# Altium footprint library Derogarian_Library.PcbLib: 99 footprints (part 2 of 7)
Each footprint in its own frame and in the unit in brackets; x right, y up, seen from the top. Pads: shape width x height; smd on the part's side, far side on the other; paste and mask are expansions set on the pad; w line width, h text height; cw(c..) or ccw(c..) is an arc to the next point about the centre after c.
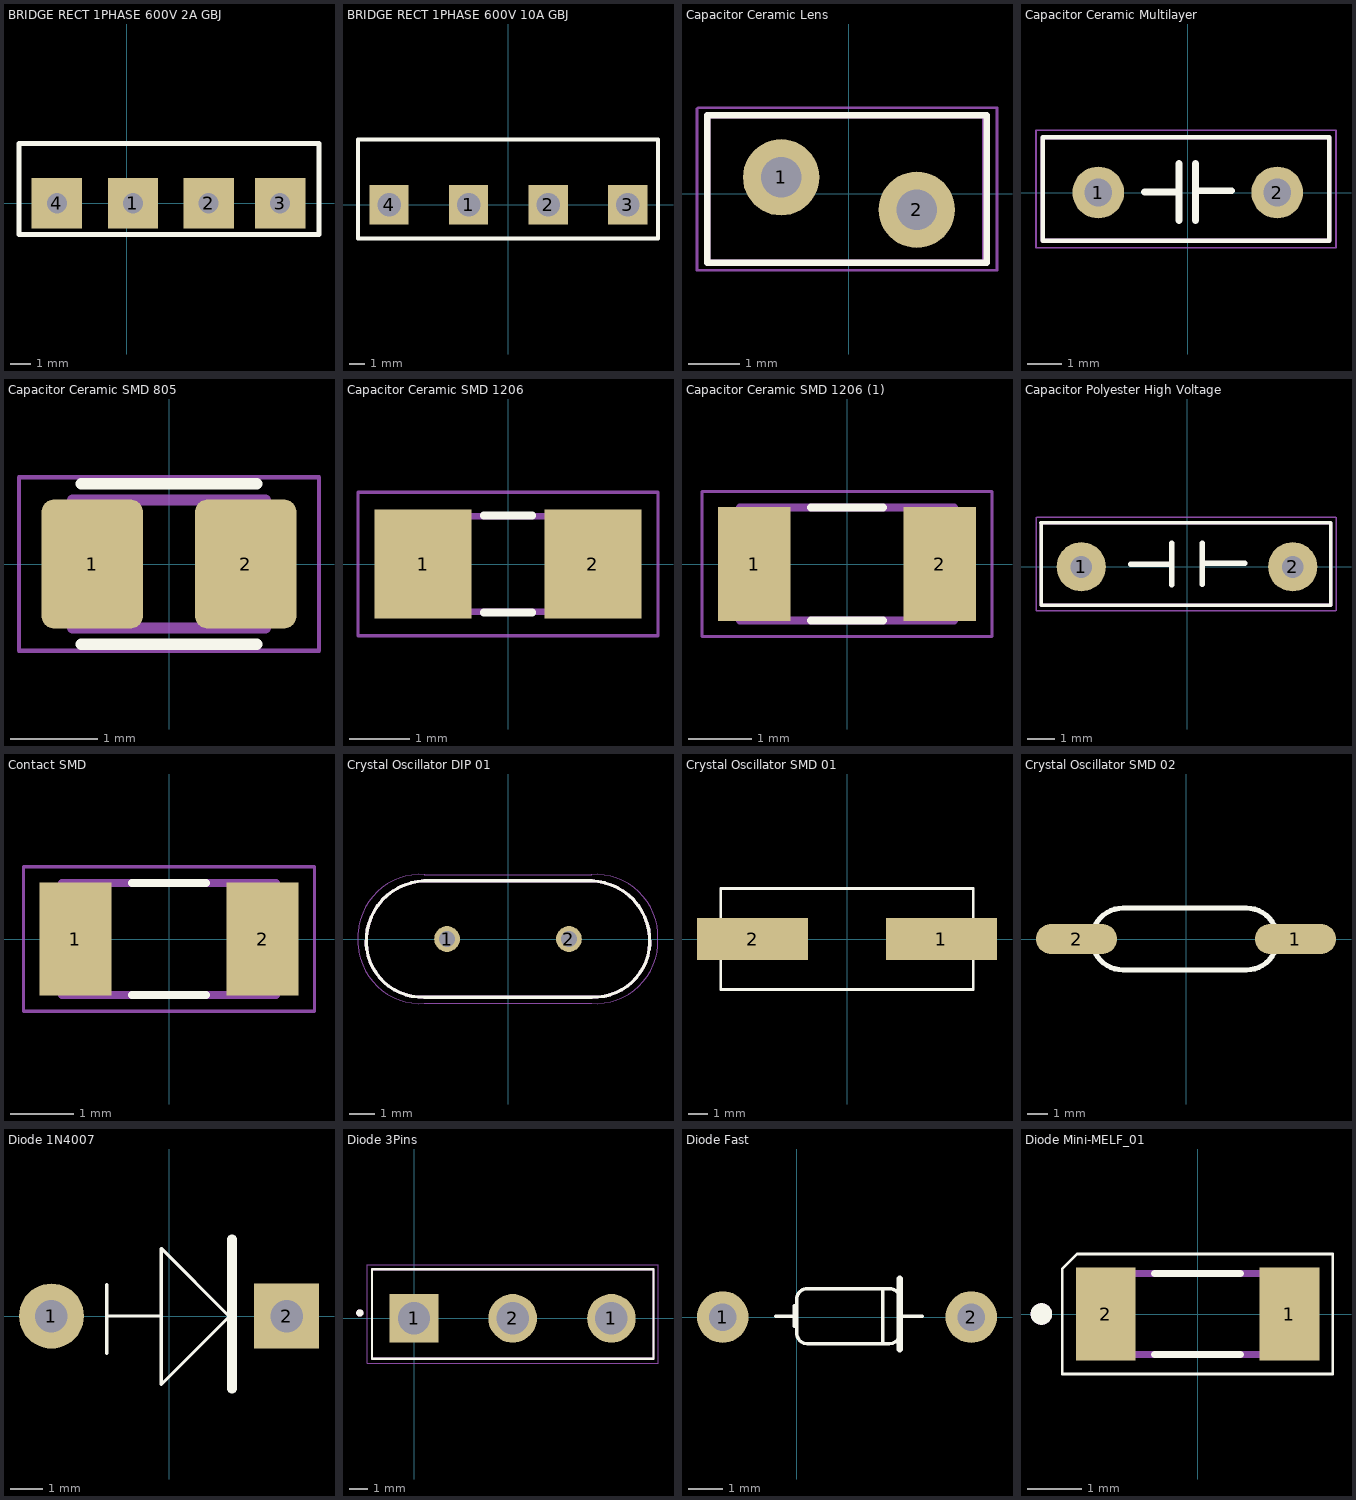
[diagram p1: the footprints below, top view; thin cyan lines are the x and y axes]

## BRIDGE RECT 1PHASE 600V 2A GBJ [mm] "GBJ1006TB"
pads (4):
  rect 2.5x2.5 hole 1: 1(0.305,0) 2(4.064,0) 3(7.62,0) 4(-3.48,0)
Top Overlay:
  lines w0.254: -5.359,-1.549 -5.359,2.972 9.55,2.972 9.55,-1.549 -5.359,-1.549
3D body "User Library-Silicon Bridge Rectifiers KBP06.STEP": height 15.68, standoff -16.67, extent -5.191,-1.256 9.559,2.794

## BRIDGE RECT 1PHASE 600V 10A GBJ [mm] "GBJ1006TB"
pads (4):
  rect 2.5x2.5 hole 1.5: 1(-2.54,0) 2(2.54,0) 3(7.62,0) 4(-7.62,0)
Top Overlay:
  lines w0.254: -9.601,-2.159 -9.601,4.166 9.55,4.166 9.55,-2.159 -9.601,-2.159
3D body "User Library-KBL-1.STEP": height 16.75, standoff -3.5, extent -9.5,-2.235 9.5,4.015

## Capacitor Ceramic Lens [mm] "Through Hole Ceramic Capacitors"
pads (2):
  round 1.5 hole 0.8: 1(-1.333,0.318) 2(1.333,-0.318)
Top Overlay:
  lines w0.127: -2.787,1.543 -2.787,-1.359 2.706,-1.359 2.706,1.537 -2.781,1.537
Mechanical 13:
  lines w0.127: -2.787,-1.359 -2.787,1.537 2.68,1.537 2.68,-1.359 -2.787,-1.359
Mechanical 15:
  lines w0.05: -2.987,1.664 -2.987,-1.511 2.909,-1.511 2.909,1.69 -2.957,1.688
3D body "User Library-Cer-Cap2 (3_5x1_5).STEP": height 4.5, standoff -2, extent -1.66,-0.853 1.84,0.648

## Capacitor Ceramic Multilayer [mm] "Through Hole Ceramic Capacitors"
pads (2):
  round 1.5 hole 0.8: 1(-2.594,0) 2(2.594,0)
Top Overlay:
  lines w0.127: -4.198,-1.398 -4.198,1.602 4.094,1.602 ; -4.194,-1.398 4.094,-1.398 ; 4.097,-1.398 4.097,1.602
  lines w0.2: -1.254,0.013 -0.254,0.013 ; -0.254,-0.813 -0.254,0.838 ; 0.229,-0.813 0.229,0.838 ; 0.27,0.051 1.27,0.051
Mechanical 13:
  lines w0.127: 4.094,-1.398 -4.198,-1.398 -4.198,1.596 -4.194,1.6 4.094,1.6 ; 4.097,-1.398 4.097,1.6
Mechanical 15:
  lines w0.05: -4.398,1.802 -4.398,-1.598 4.29,-1.598 ; -4.397,1.802 4.29,1.803 ; 4.297,-1.598 4.297,1.802
3D body "c322c104k5r5ta.stp": height 7.31, standoff -6.29, extent -2.67,-1.51 2.92,1.675

## Capacitor Ceramic SMD 805 [mm]
pads (2):
  rrect25% 1.16x1.47 smd: 1(-0.875,0) 2(0.875,0)
Top Overlay:
  lines w0.127: -1,-0.915 1,-0.915 ; -1,0.915 1,0.915
Mechanical 13:
  lines w0: -0.356,-0.737 0.356,-0.737
  lines w0.127: -1.1,-0.73 -1.1,0.73 1.1,0.73 1.1,-0.73 -1.1,-0.73
Mechanical 15:
  lines w0.05: -1.71,-0.99 -1.71,0.99 1.71,0.99 1.71,-0.99 -1.71,-0.99
3D body "C0805C102K1RACTU.STEP": height 1.23, standoff -0.04, extent -0.94,-0.686 1.092,0.711

## Capacitor Ceramic SMD 1206 [mm]
pads (2):
  rect 1.6x1.8 smd: 1(-1.4,0) 2(1.4,0)
Top Overlay:
  lines w0.127: -0.4,-0.8 0.4,-0.8 ; -0.4,0.8 0.4,0.8
Mechanical 13:
  region: -0.952,-0.851 -1.702,-0.851 -1.702,0.849 -0.952,0.849
  region: 1.702,-0.849 0.952,-0.849 0.952,0.851 1.702,0.851
  lines w0.102: -0.965,-0.787 0.965,-0.787 ; -0.965,0.787 0.965,0.787
Mechanical 15:
  lines w0.051: -2.473,-1.183 2.473,-1.183 2.473,1.183 -2.473,1.183 -2.473,-1.183
3D body "c1206c101j5gactu.stp": height 0.87, standoff -0.01, extent -1.775,-0.925 1.625,0.875

## Capacitor Ceramic SMD 1206 (1) [mm]
pads (2):
  rect 1.16x1.82 smd: 1(-1.475,0) 2(1.475,0)
Top Overlay:
  lines w0.127: -0.57,-0.9 0.57,-0.9 ; -0.57,0.9 0.57,0.9
Mechanical 13:
  lines w0.127: -1.7,-0.9 -1.7,0.9 1.7,0.9 1.7,-0.9 -1.7,-0.9
Mechanical 15:
  lines w0.05: -2.308,-1.15 -2.308,1.15 2.308,1.15 2.308,-1.15 -2.308,-1.15
3D body "c1206c106k3pactu.stp": height 1.79, standoff -0.01, extent -1.775,-0.925 1.625,0.875

## Capacitor Polyester High Voltage [mm] "Through Hole Ceramic Capacitors"
pads (2):
  round 1.8 hole 0.8: 1(-3.861,0) 2(3.861,0)
Top Overlay:
  lines w0.127: -5.333,1.602 5.238,1.602 ; -5.315,1.602 -5.315,-1.398 5.238,-1.398 ; 5.241,-1.398 5.241,1.602
  lines w0.2: -2.059,0.102 -0.559,0.102 ; -0.559,-0.648 -0.559,0.852 ; 0.559,-0.636 0.559,0.864 ; 0.608,0.127 2.108,0.127
Mechanical 13:
  lines w0.127: -5.315,-1.398 -5.315,1.596 -5.31,1.6 ; -5.307,-1.398 5.238,-1.398 ; -5.282,1.6 5.238,1.6 ; 5.241,-1.398 5.241,1.6
Mechanical 15:
  lines w0.05: -5.515,-1.598 -5.515,1.802 ; -5.51,-1.598 5.434,-1.598 ; -5.485,1.801 5.434,1.803 ; 5.441,-1.598 5.441,1.802
3D body "User Library-D6x7_5.STEP": height 9, standoff -2, extent -4.049,-1.578 4.051,1.422

## Contact SMD [mm] "SMD 1206"
pads (2):
  rect 1.13x1.77 smd: 1(-1.47,0) 2(1.47,0)
Top Overlay:
  lines w0.127: -0.58,-0.88 0.58,-0.88 ; -0.58,0.88 0.58,0.88
Mechanical 13:
  lines w0.127: -1.68,-0.88 -1.68,0.88 1.68,0.88 1.68,-0.88 -1.68,-0.88
Mechanical 15:
  lines w0.05: -2.285,-1.135 -2.285,1.135 2.285,1.135 2.285,-1.135 -2.285,-1.135
3D body "User Library-RESC3216X06N.STEP": height 0.55, standoff 0, extent -1.625,-0.774 1.575,0.826

## Crystal Oscillator DIP 01 [mm]
pads (2):
  round 1.03 hole 0.63: 1(-2.44,0) 2(2.44,0)
Top Overlay:
  lines w0.127: -5.675,-0.169 cw(c-3.26,-0.085) -3.344,2.33 ; -5.675,-0.168 ccw(c-3.435,-0.09) -3.357,-2.33 ; -3.35,-2.33 3.35,-2.33 ; -3.35,2.33 3.35,2.33 ; 3.344,2.33 cw(c3.26,-0.085) 5.675,-0.169 ; 3.357,-2.33 ccw(c3.435,-0.09) 5.675,-0.168
Mechanical 13:
  lines w0.127: -5.675,-0.169 cw(c-3.26,-0.085) -3.344,2.33 ; -5.675,-0.168 ccw(c-3.435,-0.09) -3.357,-2.33 ; -3.35,-2.33 3.35,-2.33 ; -3.35,2.33 3.35,2.33 ; 3.344,2.33 cw(c3.26,-0.085) 5.675,-0.169 ; 3.357,-2.33 ccw(c3.435,-0.09) 5.675,-0.168
Mechanical 15:
  lines w0.05: -5.999,-0.264 ccw(c-3.51,-0.09) -3.336,-2.579 ; -6,-0.25 -6,0.25 ; -5.999,0.264 cw(c-3.51,0.09) -3.336,2.579 ; -3.35,-2.58 3.35,-2.58 ; -3.35,2.58 3.35,2.58 ; 3.336,-2.579 ccw(c3.51,-0.09) 5.999,-0.264 ; 3.336,2.579 cw(c3.51,0.09) 5.999,0.264 ; 6,-0.25 6,0.25
3D body "ECS-80-18-1X.STEP": height 15.46, standoff -10.7, extent -5.75,-2.5 5.6,2.5

## Crystal Oscillator SMD 01 [mil]
pads (2):
  rect 220x83 smd: 1(187,0) 2(-187,0)
Top Overlay:
  lines w5: -250,-100 250,-100 250,100 -250,100 -250,-100
3D body "ABLS-8.000MHZ-B4-T--3DModel-STEP-400430.STEP": height 160, standoff -4, extent -246,-91 254,94

## Crystal Oscillator SMD 02 [mm]
pads (2):
  oval 4x1.5 smd: 1(5.397,0) 2(-5.397,0)
Top Overlay:
  lines w0.254: -3.112,-1.524 cw(c-3.111,0) -3.111,1.524 2.984,1.524 cw(c2.984,0) 2.984,-1.524 -2.603,-1.524 -3.111,-1.524
3D body "User Library-HC49_Crystal_SM.STEP": height 4.5, standoff -0.01, extent -7.053,-2.5 6.848,2.5

## Diode 1N4007 [mm] "Through Hole Diode"
height 2.8
pads (2):
  round 2 hole 1: 1(-3.619,0)
  rect 2x2 hole 1: 2(3.619,0)
Top Overlay:
  lines w0.1: -1.918,-1.143 -1.918,0.965 ; -1.892,0 -0.298,0 ; -0.241,-2.108 1.854,-0.013 -0.241,2.083 -0.241,-2.108
  lines w0.3: 1.943,-2.235 1.943,2.362
3D body "User Library-1N4007 x7mm.STEP": height 3.81, standoff -1.4, extent -3.963,-1.426 3.836,1.194

## Diode 3Pins [mm]
pads (3):
  rect 2.69x2.69 hole 1.79: 1(0,0)
  round 2.69 hole 1.79: 1(10.92,0) 2(5.46,0)
Top Overlay:
  circle w0.2: c-3,0.3 r0.1
  lines w0.127: -2.33,-2.235 -2.33,2.71 13.25,2.71 13.25,-2.235 -2.33,-2.235
Mechanical 13:
  circle w0.2: c-3,0.3 r0.1
  lines w0.127: -2.33,-2.235 -2.33,2.71 13.25,2.71 13.25,-2.235 -2.33,-2.235
Mechanical 15:
  lines w0.05: -2.58,-2.485 -2.58,2.965 13.5,2.965 13.5,-2.485 -2.58,-2.485
3D body "step_temp.STEP": height 30.1, standoff -5, extent -2.339,-2.485 13.261,2.515

## Diode Fast [mm] "Zener Diode"
pads (2):
  round 1.5 hole 0.8: 1(-2.159,0) 2(5.08,0)
Top Overlay:
  lines w0.1: -0.61,0.025 -0.101,0.025 ; -0.074,-0.275 -0.074,0.325 ; 3.658,0.025 2.999,0.025 ; 2.499,-0.775 2.699,-0.775 ccw(c2.699,-0.475) 2.999,-0.475 2.999,0.025 ; 2.499,-0.775 0.299,-0.775 cw(c0.299,-0.475) -0.001,-0.475 -0.001,0.525 cw(c0.299,0.525) 0.299,0.825 2.499,0.825 ; 2.499,-0.775 2.499,0.825 ; 2.499,0.825 2.699,0.825 cw(c2.699,0.525) 2.999,0.525 2.999,0.025
  lines w0.2: 2.995,-0.94 2.995,1.118
3D body "User Library-Diodo 1N914 (Pitch 280mils).STEP": height 1.84, standoff -2.82, extent -2.464,-0.686 5.264,0.991

## Diode Mini-MELF_01 [mm] "Mini-MELF"
pads (2):
  rect 1.11x1.73 smd: 1(1.705,0) 2(-1.705,0)
Top Overlay:
  circle w0.2: c-2.9,0 r0.1
  lines w0.05: -2.51,-1.115 2.51,-1.115 2.51,1.115 -2.238,1.115 -2.51,0.843 -2.51,-1.115
  lines w0.127: -0.8,-0.75 0.8,-0.75 ; -0.8,0.75 0.8,0.75
Mechanical 13:
  circle w0.2: c-2.9,0 r0.1
  lines w0.127: -1.75,-0.75 1.75,-0.75 1.75,0.75 -1.75,0.75 -1.75,-0.75
3D body "BZT55B22 L0G.STEP": height 1.6, standoff 0, extent -1.725,-0.775 1.775,0.825